# Altium footprint library WE-SHC.PcbLib: 139 footprints (part 1 of 10)
Each footprint in its own frame and in the unit in brackets; x right, y up, seen from the top. Pads: shape width x height; smd on the part's side, far side on the other; paste and mask are expansions set on the pad; w line width, h text height; cw(c..) or ccw(c..) is an arc to the next point about the centre after c.
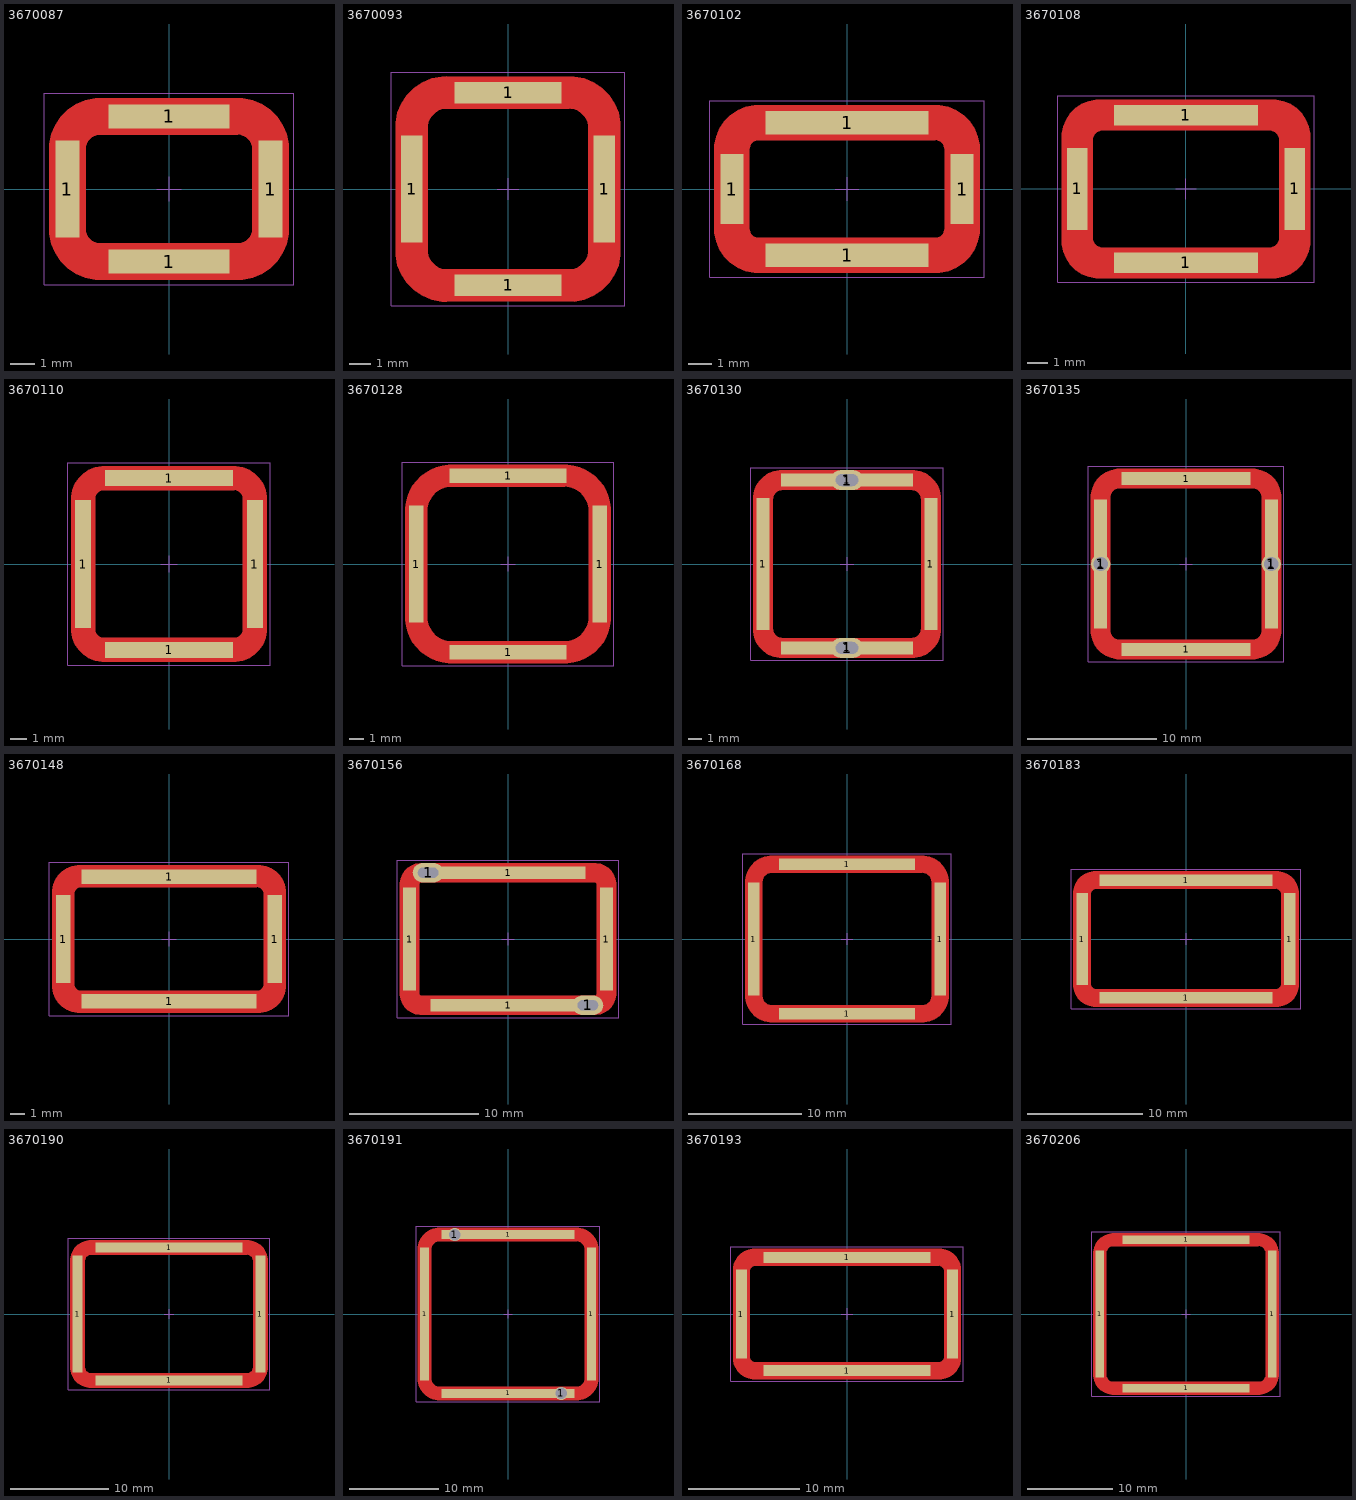
[diagram p0: the footprints below, top view; thin cyan lines are the x and y axes]

## 3670087 [mm] "Shielding Cabinet, SMT Frame Seamless, 8.7x6.3x3mm"
height 3
pads (4):
  rect 1x4 smd paste-2539.97 mask-2222: 1(-4.2,0) 1(4.2,0)
  rect 5x1 smd paste-2539.97 mask-2222: 1(0,-3) 1(0,3)
Top Layer:
  region: -4.95,-0.25 -4.95,-1.65 -4.95,-1.857 -4.869,-2.263 -4.711,-2.645 -4.481,-2.989 -4.189,-3.281 -3.845,-3.511 -3.463,-3.669 -3.057,-3.75 -2.85,-3.75 2.85,-3.75 3.057,-3.75 3.463,-3.669 3.845,-3.511 4.189,-3.281 4.481,-2.989 4.711,-2.645 4.869,-2.263 4.95,-1.857 4.95,-1.65 4.95,-0.25 3.45,-0.25 3.45,-1.65 3.438,-1.767 3.349,-1.983 3.183,-2.149 2.967,-2.238 2.85,-2.25 -2.85,-2.25 -2.967,-2.238 -3.183,-2.149 -3.349,-1.983 -3.438,-1.767 -3.45,-1.65 -3.45,-0.25
  region: -4.95,-1 -4.95,1.65 -4.95,1.857 -4.869,2.263 -4.711,2.645 -4.481,2.989 -4.189,3.281 -3.845,3.511 -3.463,3.669 -3.057,3.75 -2.85,3.75 2.85,3.75 3.057,3.75 3.463,3.669 3.845,3.511 4.189,3.281 4.481,2.989 4.711,2.645 4.869,2.263 4.95,1.857 4.95,1.65 4.95,-1 3.45,-1 3.45,1.65 3.438,1.767 3.349,1.983 3.183,2.149 2.967,2.238 2.85,2.25 -2.85,2.25 -2.967,2.238 -3.183,2.149 -3.349,1.983 -3.438,1.767 -3.45,1.65 -3.45,-1
Top Paste:
  region: -4.95,0.25 -4.95,1.65 -4.95,1.857 -4.869,2.263 -4.711,2.645 -4.481,2.989 -4.189,3.281 -3.845,3.511 -3.463,3.669 -3.057,3.75 -2.85,3.75 2.85,3.75 3.057,3.75 3.463,3.669 3.845,3.511 4.189,3.281 4.481,2.989 4.711,2.645 4.869,2.263 4.95,1.857 4.95,1.65 4.95,0.25 3.45,0.25 3.45,1.65 3.438,1.767 3.349,1.983 3.183,2.149 2.967,2.238 2.85,2.25 -2.85,2.25 -2.967,2.238 -3.183,2.149 -3.349,1.983 -3.438,1.767 -3.45,1.65 -3.45,0.25
  region: -4.95,-0.25 -4.95,-1.65 -4.95,-1.857 -4.869,-2.263 -4.711,-2.645 -4.481,-2.989 -4.189,-3.281 -3.845,-3.511 -3.463,-3.669 -3.057,-3.75 -2.85,-3.75 2.85,-3.75 3.057,-3.75 3.463,-3.669 3.845,-3.511 4.189,-3.281 4.481,-2.989 4.711,-2.645 4.869,-2.263 4.95,-1.857 4.95,-1.65 4.95,-0.25 3.45,-0.25 3.45,-1.65 3.438,-1.767 3.349,-1.983 3.183,-2.149 2.967,-2.238 2.85,-2.25 -2.85,-2.25 -2.967,-2.238 -3.183,-2.149 -3.349,-1.983 -3.438,-1.767 -3.45,-1.65 -3.45,-0.25
Notes:
  text "recommended tin paste thickness=0.5mm / customer to define the final stencil gap" at -4.45,-5.25 h0.3
Top Designator:
  text ".Designator" at -7.498,-0.5 h1.5
Top Component Outline:
  lines w0.1: -4.35,-1.65 ccw(c-2.85,-1.65) -2.85,-3.15 2.85,-3.15 ccw(c2.85,-1.65) 4.35,-1.65 4.35,1.65 ccw(c2.85,1.65) 2.85,3.15 -2.85,3.15 ccw(c-2.85,1.65) -4.35,1.65 -4.35,-1.65
Top 3D Body:
  lines w0.1: -4.35,-1.65 ccw(c-2.85,-1.65) -2.85,-3.15 2.85,-3.15 ccw(c2.85,-1.65) 4.35,-1.65 4.35,1.65 ccw(c2.85,1.65) 2.85,3.15 -2.85,3.15 ccw(c-2.85,1.65) -4.35,1.65 -4.35,-1.65
Top Courtyard:
  lines w0.05: -0.5,0 0.5,0 ; 0,-0.5 0,0.5 ; -5.15,-3.95 5.15,-3.95 5.15,3.95 -5.15,3.95 -5.15,-3.95
3D body "3670087.stp": height 3, standoff 0, extent -4.35,-3.15 4.35,3.15

## 3670093 [mm] "Shielding Cabinet, SMT Frame Seamless, 9.3x9.3x5mm"
height 5
pads (4):
  rect 1x5 smd paste-2539.97 mask-2222: 1(-4.5,0) 1(4.5,0)
  rect 5x1 smd paste-2539.97 mask-2222: 1(0,-4.5) 1(0,4.5)
Top Layer:
  region: -5.25,-0.25 -5.25,-2.85 -5.25,-3.086 -5.158,-3.55 -4.977,-3.987 -4.714,-4.38 -4.38,-4.714 -3.987,-4.977 -3.55,-5.158 -3.086,-5.25 -2.85,-5.25 2.85,-5.25 3.086,-5.25 3.55,-5.158 3.987,-4.977 4.38,-4.714 4.714,-4.38 4.977,-3.987 5.158,-3.55 5.25,-3.086 5.25,-2.85 5.25,-0.25 3.75,-0.25 3.75,-2.85 3.746,-2.938 3.711,-3.111 3.644,-3.274 3.546,-3.421 3.421,-3.546 3.274,-3.644 3.111,-3.711 2.938,-3.746 2.85,-3.75 -2.85,-3.75 -2.938,-3.746 -3.111,-3.711 -3.274,-3.644 -3.421,-3.546 -3.546,-3.421 -3.644,-3.274 -3.711,-3.111 -3.746,-2.938 -3.75,-2.85 -3.75,-0.25
  region: -5.25,-1 -5.25,2.85 -5.25,3.086 -5.158,3.55 -4.977,3.987 -4.714,4.38 -4.38,4.714 -3.987,4.977 -3.55,5.158 -3.086,5.25 -2.85,5.25 2.85,5.25 3.086,5.25 3.55,5.158 3.987,4.977 4.38,4.714 4.714,4.38 4.977,3.987 5.158,3.55 5.25,3.086 5.25,2.85 5.25,-1 3.75,-1 3.75,2.85 3.746,2.938 3.711,3.111 3.644,3.274 3.546,3.421 3.421,3.546 3.274,3.644 3.111,3.711 2.938,3.746 2.85,3.75 -2.85,3.75 -2.938,3.746 -3.111,3.711 -3.274,3.644 -3.421,3.546 -3.546,3.421 -3.644,3.274 -3.711,3.111 -3.746,2.938 -3.75,2.85 -3.75,-1
Top Paste:
  region: -5.25,0.25 -5.25,2.85 -5.25,3.086 -5.158,3.55 -4.977,3.987 -4.714,4.38 -4.38,4.714 -3.987,4.977 -3.55,5.158 -3.086,5.25 -2.85,5.25 2.85,5.25 3.086,5.25 3.55,5.158 3.987,4.977 4.38,4.714 4.714,4.38 4.977,3.987 5.158,3.55 5.25,3.086 5.25,2.85 5.25,0.25 3.75,0.25 3.75,2.85 3.746,2.938 3.711,3.111 3.644,3.274 3.546,3.421 3.421,3.546 3.274,3.644 3.111,3.711 2.938,3.746 2.85,3.75 -2.85,3.75 -2.938,3.746 -3.111,3.711 -3.274,3.644 -3.421,3.546 -3.546,3.421 -3.644,3.274 -3.711,3.111 -3.746,2.938 -3.75,2.85 -3.75,0.25
  region: -5.25,-0.25 -5.25,-2.85 -5.25,-3.086 -5.158,-3.55 -4.977,-3.987 -4.714,-4.38 -4.38,-4.714 -3.987,-4.977 -3.55,-5.158 -3.086,-5.25 -2.85,-5.25 2.85,-5.25 3.086,-5.25 3.55,-5.158 3.987,-4.977 4.38,-4.714 4.714,-4.38 4.977,-3.987 5.158,-3.55 5.25,-3.086 5.25,-2.85 5.25,-0.25 3.75,-0.25 3.75,-2.85 3.746,-2.938 3.711,-3.111 3.644,-3.274 3.546,-3.421 3.421,-3.546 3.274,-3.644 3.111,-3.711 2.938,-3.746 2.85,-3.75 -2.85,-3.75 -2.938,-3.746 -3.111,-3.711 -3.274,-3.644 -3.421,-3.546 -3.546,-3.421 -3.644,-3.274 -3.711,-3.111 -3.746,-2.938 -3.75,-2.85 -3.75,-0.25
Notes:
  text "recommended tin paste thickness=0.5mm / customer to define the final stencil gap" at -4.75,-6.65 h0.3
Top Designator:
  text ".Designator" at -7.498,-0.5 h1.5
Top Component Outline:
  lines w0.1: -4.65,-2.9 ccw(c-2.9,-2.9) -2.9,-4.65 2.9,-4.65 ccw(c2.9,-2.9) 4.65,-2.9 4.65,2.9 ccw(c2.9,2.9) 2.9,4.65 -2.9,4.65 ccw(c-2.9,2.9) -4.65,2.9 -4.65,-2.9
Top 3D Body:
  lines w0.1: -4.65,-2.9 ccw(c-2.9,-2.9) -2.9,-4.65 2.9,-4.65 ccw(c2.9,-2.9) 4.65,-2.9 4.65,2.9 ccw(c2.9,2.9) 2.9,4.65 -2.9,4.65 ccw(c-2.9,2.9) -4.65,2.9 -4.65,-2.9
Top Courtyard:
  lines w0.05: -0.5,0 0.5,0 ; 0,-0.5 0,0.5 ; -5.45,-5.45 -5.45,5.45 5.45,5.45 5.45,-5.45 -5.45,-5.45
3D body "3670093.stp": height 5, standoff 0, extent -4.65,-4.65 4.65,4.65

## 3670102 [mm] "Shielding Cabinet, SMT Frame Seamless, 10.2x6x3mm"
height 3
pads (4):
  rect 1x3 smd paste-2539.97 mask-2222: 1(-4.95,0) 1(4.95,0)
  rect 7x1 smd paste-2539.97 mask-2222: 1(0,-2.85) 1(0,2.85)
Top Layer:
  region: -5.7,-0.25 -5.7,-1.7 -5.7,-1.887 -5.627,-2.254 -5.484,-2.6 -5.276,-2.911 -5.011,-3.176 -4.7,-3.384 -4.354,-3.527 -3.987,-3.6 -3.8,-3.6 3.8,-3.6 3.987,-3.6 4.354,-3.527 4.7,-3.384 5.011,-3.176 5.276,-2.911 5.484,-2.6 5.627,-2.254 5.7,-1.887 5.7,-1.7 5.7,-0.25 4.2,-0.25 4.2,-1.7 4.192,-1.778 4.133,-1.922 4.022,-2.033 3.878,-2.092 3.8,-2.1 -3.8,-2.1 -3.878,-2.092 -4.022,-2.033 -4.133,-1.922 -4.192,-1.778 -4.2,-1.7 -4.2,-0.25
  region: -5.7,-1 -5.7,1.7 -5.7,1.887 -5.627,2.254 -5.484,2.6 -5.276,2.911 -5.011,3.176 -4.7,3.384 -4.354,3.527 -3.987,3.6 -3.8,3.6 3.8,3.6 3.987,3.6 4.354,3.527 4.7,3.384 5.011,3.176 5.276,2.911 5.484,2.6 5.627,2.254 5.7,1.887 5.7,1.7 5.7,-1 4.2,-1 4.2,1.7 4.192,1.778 4.133,1.922 4.022,2.033 3.878,2.092 3.8,2.1 -3.8,2.1 -3.878,2.092 -4.022,2.033 -4.133,1.922 -4.192,1.778 -4.2,1.7 -4.2,-1
Top Paste:
  region: -5.7,0.25 -5.7,1.7 -5.7,1.887 -5.627,2.254 -5.484,2.6 -5.276,2.911 -5.011,3.176 -4.7,3.384 -4.354,3.527 -3.987,3.6 -3.8,3.6 3.8,3.6 3.987,3.6 4.354,3.527 4.7,3.384 5.011,3.176 5.276,2.911 5.484,2.6 5.627,2.254 5.7,1.887 5.7,1.7 5.7,0.25 4.2,0.25 4.2,1.7 4.192,1.778 4.133,1.922 4.022,2.033 3.878,2.092 3.8,2.1 -3.8,2.1 -3.878,2.092 -4.022,2.033 -4.133,1.922 -4.192,1.778 -4.2,1.7 -4.2,0.25
  region: -5.7,-0.25 -5.7,-1.7 -5.7,-1.887 -5.627,-2.254 -5.484,-2.6 -5.276,-2.911 -5.011,-3.176 -4.7,-3.384 -4.354,-3.527 -3.987,-3.6 -3.8,-3.6 3.8,-3.6 3.987,-3.6 4.354,-3.527 4.7,-3.384 5.011,-3.176 5.276,-2.911 5.484,-2.6 5.627,-2.254 5.7,-1.887 5.7,-1.7 5.7,-0.25 4.2,-0.25 4.2,-1.7 4.192,-1.778 4.133,-1.922 4.022,-2.033 3.878,-2.092 3.8,-2.1 -3.8,-2.1 -3.878,-2.092 -4.022,-2.033 -4.133,-1.922 -4.192,-1.778 -4.2,-1.7 -4.2,-0.25
Notes:
  text "recommended tin paste thickness=0.1mm / customer to define the final stencil gap" at -5.9,-5.3 h0.4
Top Designator:
  text ".Designator" at -7.498,-0.5 h1.5
Top Component Outline:
  lines w0.1: -5.1,-1.75 ccw(c-3.85,-1.75) -3.85,-3 3.85,-3 ccw(c3.85,-1.75) 5.1,-1.75 5.1,1.75 ccw(c3.85,1.75) 3.85,3 -3.85,3 ccw(c-3.85,1.75) -5.1,1.75 -5.1,-1.75
Top 3D Body:
  lines w0.1: -5.1,-1.75 ccw(c-3.85,-1.75) -3.85,-3 3.85,-3 ccw(c3.85,-1.75) 5.1,-1.75 5.1,1.75 ccw(c3.85,1.75) 3.85,3 -3.85,3 ccw(c-3.85,1.75) -5.1,1.75 -5.1,-1.75
Top Courtyard:
  lines w0.05: -0.5,0 0.5,0 ; 0,-0.5 0,0.5 ; -5.9,-3.8 -5.9,3.8 5.9,3.8 5.9,-3.8 -5.9,-3.8
3D body "3670102.stp": height 3, standoff 0, extent -5.1,-3 5.1,3

## 3670108 [mm] "Shielding Cabinet, SMT Frame Seamless, 10.8x7.4x2mm"
height 2
pads (4):
  rect 1x4 smd paste-2539.97 mask-2222: 1(-5.3,0) 1(5.3,0)
  rect 7x1 smd paste-2539.97 mask-2222: 1(0,-3.6) 1(0,3.6)
Top Layer:
  region: -6.05,-0.925 -6.05,2.5 -6.05,2.682 -5.979,3.04 -5.839,3.376 -5.637,3.679 -5.379,3.937 -5.076,4.139 -4.74,4.279 -4.382,4.35 -4.2,4.35 4.2,4.35 4.382,4.35 4.74,4.279 5.076,4.139 5.379,3.937 5.637,3.679 5.839,3.376 5.979,3.04 6.05,2.682 6.05,2.5 6.05,-0.925 4.55,-0.925 4.55,2.387 4.541,2.478 4.472,2.644 4.344,2.772 4.178,2.841 4.088,2.85 -4.088,2.85 -4.178,2.841 -4.344,2.772 -4.472,2.644 -4.541,2.478 -4.55,2.387 -4.55,-0.925
  region: -6.05,-0.25 -6.05,-2.5 -6.05,-2.682 -5.979,-3.04 -5.839,-3.376 -5.637,-3.679 -5.379,-3.937 -5.076,-4.139 -4.74,-4.279 -4.382,-4.35 -4.2,-4.35 4.2,-4.35 4.382,-4.35 4.74,-4.279 5.076,-4.139 5.379,-3.937 5.637,-3.679 5.839,-3.376 5.979,-3.04 6.05,-2.682 6.05,-2.5 6.05,-0.25 4.55,-0.25 4.55,-2.387 4.541,-2.478 4.472,-2.644 4.344,-2.772 4.178,-2.841 4.088,-2.85 -4.088,-2.85 -4.178,-2.841 -4.344,-2.772 -4.472,-2.644 -4.541,-2.478 -4.55,-2.387 -4.55,-0.25
Top Paste:
  region: -6.05,-0.25 -6.05,-2.5 -6.05,-2.682 -5.979,-3.04 -5.839,-3.376 -5.637,-3.679 -5.379,-3.937 -5.076,-4.139 -4.74,-4.279 -4.382,-4.35 -4.2,-4.35 4.2,-4.35 4.382,-4.35 4.74,-4.279 5.076,-4.139 5.379,-3.937 5.637,-3.679 5.839,-3.376 5.979,-3.04 6.05,-2.682 6.05,-2.5 6.05,-0.25 4.55,-0.25 4.55,-2.387 4.541,-2.478 4.472,-2.644 4.344,-2.772 4.178,-2.841 4.088,-2.85 -4.088,-2.85 -4.178,-2.841 -4.344,-2.772 -4.472,-2.644 -4.541,-2.478 -4.55,-2.387 -4.55,-0.25
  region: -6.05,0.25 -6.05,2.5 -6.05,2.682 -5.979,3.04 -5.839,3.376 -5.637,3.679 -5.379,3.937 -5.076,4.139 -4.74,4.279 -4.382,4.35 -4.2,4.35 4.2,4.35 4.382,4.35 4.74,4.279 5.076,4.139 5.379,3.937 5.637,3.679 5.839,3.376 5.979,3.04 6.05,2.682 6.05,2.5 6.05,0.25 4.55,0.25 4.55,2.387 4.541,2.478 4.472,2.644 4.344,2.772 4.178,2.841 4.088,2.85 -4.088,2.85 -4.178,2.841 -4.344,2.772 -4.472,2.644 -4.541,2.478 -4.55,2.387 -4.55,0.25
Notes:
  text "recommended tin paste thickness=0.5mm / customer to define the final stencil gap" at -6.25,-5.95 h0.4
Top Designator:
  text ".Designator" at -7.498,-0.5 h1.5
Top Component Outline:
  lines w0.1: -5.4,-2.45 ccw(c-4.15,-2.45) -4.15,-3.7 4.15,-3.7 ccw(c4.15,-2.45) 5.4,-2.45 5.4,2.45 ccw(c4.15,2.45) 4.15,3.7 -4.15,3.7 ccw(c-4.15,2.45) -5.4,2.45 -5.4,-2.45
Top 3D Body:
  lines w0.1: -5.4,-2.45 ccw(c-4.15,-2.45) -4.15,-3.7 4.15,-3.7 ccw(c4.15,-2.45) 5.4,-2.45 5.4,2.45 ccw(c4.15,2.45) 4.15,3.7 -4.15,3.7 ccw(c-4.15,2.45) -5.4,2.45 -5.4,-2.45
Top Courtyard:
  lines w0.05: -0.5,0 0.5,0 ; 0,-0.5 0,0.5 ; -6.25,-4.55 -6.25,4.55 6.25,4.55 6.25,-4.55 -6.25,-4.55
3D body "3670108.stp": height 2, standoff 0, extent -5.4,-3.7 5.4,3.7

## 3670110 [mm] "Shielding Cabinet, SMT Frame Seamless, 11x11x2.8mm"
height 2.8
pads (4):
  rect 1x8 smd paste-2539.97 mask-2222: 1(-5.35,0) 1(5.35,0)
  rect 8x1 smd paste-2539.97 mask-2222: 1(0,-5.35) 1(0,5.35)
Top Layer:
  region: -6.1,-1.05 -6.1,4 -6.1,4.207 -6.019,4.613 -5.861,4.995 -5.631,5.339 -5.339,5.631 -4.995,5.861 -4.613,6.019 -4.207,6.1 -4,6.1 4,6.1 4.207,6.1 4.613,6.019 4.995,5.861 5.339,5.631 5.631,5.339 5.861,4.995 6.019,4.613 6.1,4.207 6.1,4 6.1,-1.05 4.6,-1.05 4.6,4.075 4.59,4.177 4.512,4.367 4.367,4.512 4.177,4.59 4.075,4.6 -4.075,4.6 -4.177,4.59 -4.367,4.512 -4.512,4.367 -4.59,4.177 -4.6,4.075 -4.6,-1.05
  region: -6.1,-0.25 -6.1,-4 -6.1,-4.207 -6.019,-4.613 -5.861,-4.995 -5.631,-5.339 -5.339,-5.631 -4.995,-5.861 -4.613,-6.019 -4.207,-6.1 -4,-6.1 4,-6.1 4.207,-6.1 4.613,-6.019 4.995,-5.861 5.339,-5.631 5.631,-5.339 5.861,-4.995 6.019,-4.613 6.1,-4.207 6.1,-4 6.1,-0.25 4.6,-0.25 4.6,-4.075 4.59,-4.177 4.512,-4.367 4.367,-4.512 4.177,-4.59 4.075,-4.6 -4.075,-4.6 -4.177,-4.59 -4.367,-4.512 -4.512,-4.367 -4.59,-4.177 -4.6,-4.075 -4.6,-0.25
Top Paste:
  region: -6.1,-0.25 -6.1,-4 -6.1,-4.207 -6.019,-4.613 -5.861,-4.995 -5.631,-5.339 -5.339,-5.631 -4.995,-5.861 -4.613,-6.019 -4.207,-6.1 -4,-6.1 4,-6.1 4.207,-6.1 4.613,-6.019 4.995,-5.861 5.339,-5.631 5.631,-5.339 5.861,-4.995 6.019,-4.613 6.1,-4.207 6.1,-4 6.1,-0.25 4.6,-0.25 4.6,-4.075 4.59,-4.177 4.512,-4.367 4.367,-4.512 4.177,-4.59 4.075,-4.6 -4.075,-4.6 -4.177,-4.59 -4.367,-4.512 -4.512,-4.367 -4.59,-4.177 -4.6,-4.075 -4.6,-0.25
  region: -6.1,0.25 -6.1,4 -6.1,4.207 -6.019,4.613 -5.861,4.995 -5.631,5.339 -5.339,5.631 -4.995,5.861 -4.613,6.019 -4.207,6.1 -4,6.1 4,6.1 4.207,6.1 4.613,6.019 4.995,5.861 5.339,5.631 5.631,5.339 5.861,4.995 6.019,4.613 6.1,4.207 6.1,4 6.1,0.25 4.6,0.25 4.6,4.075 4.59,4.177 4.512,4.367 4.367,4.512 4.177,4.59 4.075,4.6 -4.075,4.6 -4.177,4.59 -4.367,4.512 -4.512,4.367 -4.59,4.177 -4.6,4.075 -4.6,0.25
Notes:
  text "recommended tin paste thickness=0.5mm / customer to define the final stencil gap" at -6.3,-7.7 h0.4
Top Designator:
  text ".Designator" at -7.498,-0.5 h1.5
Top Component Outline:
  lines w0.1: -5.5,-4 ccw(c-4,-4) -4,-5.5 4,-5.5 ccw(c4,-4) 5.5,-4 5.5,4 ccw(c4,4) 4,5.5 -4,5.5 ccw(c-4,4) -5.5,4 -5.5,-4
Top 3D Body:
  lines w0.1: -5.5,-4 ccw(c-4,-4) -4,-5.5 4,-5.5 ccw(c4,-4) 5.5,-4 5.5,4 ccw(c4,4) 4,5.5 -4,5.5 ccw(c-4,4) -5.5,4 -5.5,-4
Top Courtyard:
  lines w0.05: -0.5,0 0.5,0 ; 0,-0.5 0,0.5 ; -6.3,-6.3 -6.3,6.3 6.3,6.3 6.3,-6.3 -6.3,-6.3
3D body "3670110.stp": height 2.8, standoff 0, extent -5.5,-5.5 5.5,5.5

## 3670128 [mm] "Shielding Cabinet, SMT Frame Seamless, 12.8x12.3x7.5mm"
height 7.5
pads (4):
  rect 1x8 smd paste-2539.97 mask-2222: 1(-6.3,0) 1(6.3,0)
  rect 8x1 smd paste-2539.97 mask-2222: 1(0,-6.05) 1(0,6.05)
Top Layer:
  region: -7.05,-0.25 -7.05,-3.65 -7.05,-3.856 -6.996,-4.266 -6.889,-4.665 -6.731,-5.046 -6.525,-5.404 -6.273,-5.731 -5.981,-6.023 -5.654,-6.275 -5.296,-6.481 -4.915,-6.639 -4.516,-6.746 -4.106,-6.8 -3.9,-6.8 3.9,-6.8 4.106,-6.8 4.516,-6.746 4.915,-6.639 5.296,-6.481 5.654,-6.275 5.981,-6.023 6.273,-5.731 6.525,-5.404 6.731,-5.046 6.889,-4.665 6.996,-4.266 7.05,-3.856 7.05,-3.65 7.05,-0.25 5.55,-0.25 5.55,-3.65 5.542,-3.812 5.479,-4.129 5.355,-4.428 5.175,-4.697 4.947,-4.925 4.678,-5.105 4.379,-5.229 4.062,-5.292 3.9,-5.3 -3.9,-5.3 -4.062,-5.292 -4.379,-5.229 -4.678,-5.105 -4.947,-4.925 -5.175,-4.697 -5.355,-4.428 -5.479,-4.129 -5.542,-3.812 -5.55,-3.65 -5.55,-0.25
  region: -7.05,-1 -7.05,3.65 -7.05,3.856 -6.996,4.266 -6.889,4.665 -6.731,5.046 -6.525,5.404 -6.273,5.731 -5.981,6.023 -5.654,6.275 -5.296,6.481 -4.915,6.639 -4.516,6.746 -4.106,6.8 -3.9,6.8 3.9,6.8 4.106,6.8 4.516,6.746 4.915,6.639 5.296,6.481 5.654,6.275 5.981,6.023 6.273,5.731 6.525,5.404 6.731,5.046 6.889,4.665 6.996,4.266 7.05,3.856 7.05,3.65 7.05,-1 5.55,-1 5.55,3.65 5.542,3.812 5.479,4.129 5.355,4.428 5.175,4.697 4.947,4.925 4.678,5.105 4.379,5.229 4.062,5.292 3.9,5.3 -3.9,5.3 -4.062,5.292 -4.379,5.229 -4.678,5.105 -4.947,4.925 -5.175,4.697 -5.355,4.428 -5.479,4.129 -5.542,3.812 -5.55,3.65 -5.55,-1
Top Paste:
  drawing of 3 lines, arcs and shapes, not listed
Notes:
  text "recommended tin paste thickness=0.1mm / customer to define the final stencil gap" at -6.2,-8.5 h0.4
Top Designator:
  text ".Designator" at -7.498,-0.5 h1.5
Top Component Outline:
  lines w0.1: -6.4,-3.9 -6.4,3.65 cw(c-3.9,3.65) -3.9,6.15 3.9,6.15 cw(c3.9,3.65) 6.4,3.65 6.4,-3.9 ; -6.4,-3.65 ccw(c-3.9,-3.65) -3.9,-6.15 3.9,-6.15 ccw(c3.9,-3.65) 6.4,-3.65
Top 3D Body:
  lines w0.1: -6.4,-3.9 -6.4,3.65 cw(c-3.9,3.65) -3.9,6.15 3.9,6.15 cw(c3.9,3.65) 6.4,3.65 6.4,-3.9 ; -6.4,-3.65 ccw(c-3.9,-3.65) -3.9,-6.15 3.9,-6.15 ccw(c3.9,-3.65) 6.4,-3.65
Top Courtyard:
  lines w0.05: -0.5,0 0.5,0 ; 0,-0.5 0,0.5 ; -7.25,-7 -7.25,7 7.25,7 7.25,-7 -7.25,-7
3D body "3670128.stp": height 7.5, standoff 0, extent -6.4,-6.15 6.4,6.15

## 3670130 [mm] "Shielding Cabinet, SMT Frame Seamless, 13x13x5mm"
height 5
pads (6):
  rect 1x10 smd paste-2539.97 mask-2222: 1(-6.35,0) 1(6.35,0)
  rect 10x1 smd paste-2539.97 mask-2222: 1(0,-6.35) 1(0,6.35)
  oval 2.5x1.5 hole 0.9 slot 1.7 at 0 deg: 1(0,-6.35) 1(0,6.35)
Top Layer:
  region: -7.1,-1 -7.1,4.9 -7.1,5.117 -7.015,5.542 -6.85,5.942 -6.609,6.302 -6.302,6.609 -5.942,6.85 -5.542,7.015 -5.117,7.1 -4.9,7.1 4.9,7.1 5.117,7.1 5.542,7.015 5.942,6.85 6.302,6.609 6.609,6.302 6.85,5.942 7.015,5.542 7.1,5.117 7.1,4.9 7.1,-1 5.6,-1 5.6,4.9 5.597,4.969 5.57,5.103 5.517,5.23 5.441,5.344 5.344,5.441 5.23,5.517 5.103,5.57 4.969,5.597 4.9,5.6 -4.9,5.6 -4.969,5.597 -5.103,5.57 -5.23,5.517 -5.344,5.441 -5.441,5.344 -5.517,5.23 -5.57,5.103 -5.597,4.969 -5.6,4.9 -5.6,-1
  region: -7.1,-0.25 -7.1,-4.9 -7.1,-5.117 -7.015,-5.542 -6.85,-5.942 -6.609,-6.302 -6.302,-6.609 -5.942,-6.85 -5.542,-7.015 -5.117,-7.1 -4.9,-7.1 4.9,-7.1 5.117,-7.1 5.542,-7.015 5.942,-6.85 6.302,-6.609 6.609,-6.302 6.85,-5.942 7.015,-5.542 7.1,-5.117 7.1,-4.9 7.1,-0.25 5.6,-0.25 5.6,-4.9 5.597,-4.969 5.57,-5.103 5.517,-5.23 5.441,-5.344 5.344,-5.441 5.23,-5.517 5.103,-5.57 4.969,-5.597 4.9,-5.6 -4.9,-5.6 -4.969,-5.597 -5.103,-5.57 -5.23,-5.517 -5.344,-5.441 -5.441,-5.344 -5.517,-5.23 -5.57,-5.103 -5.597,-4.969 -5.6,-4.9 -5.6,-0.25
Top Paste:
  region: -7.1,-0.25 -7.1,-4.9 -7.1,-5.117 -7.015,-5.542 -6.85,-5.942 -6.609,-6.302 -6.302,-6.609 -5.942,-6.85 -5.542,-7.015 -5.117,-7.1 -4.9,-7.1 4.9,-7.1 5.117,-7.1 5.542,-7.015 5.942,-6.85 6.302,-6.609 6.609,-6.302 6.85,-5.942 7.015,-5.542 7.1,-5.117 7.1,-4.9 7.1,-0.25 5.6,-0.25 5.6,-4.9 5.597,-4.969 5.57,-5.103 5.517,-5.23 5.441,-5.344 5.344,-5.441 5.23,-5.517 5.103,-5.57 4.969,-5.597 4.9,-5.6 -4.9,-5.6 -4.969,-5.597 -5.103,-5.57 -5.23,-5.517 -5.344,-5.441 -5.441,-5.344 -5.517,-5.23 -5.57,-5.103 -5.597,-4.969 -5.6,-4.9 -5.6,-0.25
  region: -7.1,0.25 -7.1,4.9 -7.1,5.117 -7.015,5.542 -6.85,5.942 -6.609,6.302 -6.302,6.609 -5.942,6.85 -5.542,7.015 -5.117,7.1 -4.9,7.1 4.9,7.1 5.117,7.1 5.542,7.015 5.942,6.85 6.302,6.609 6.609,6.302 6.85,5.942 7.015,5.542 7.1,5.117 7.1,4.9 7.1,0.25 5.6,0.25 5.6,4.9 5.597,4.969 5.57,5.103 5.517,5.23 5.441,5.344 5.344,5.441 5.23,5.517 5.103,5.57 4.969,5.597 4.9,5.6 -4.9,5.6 -4.969,5.597 -5.103,5.57 -5.23,5.517 -5.344,5.441 -5.441,5.344 -5.517,5.23 -5.57,5.103 -5.597,4.969 -5.6,4.9 -5.6,0.25
Notes:
  text "recommended tin paste thickness=0.5mm / customer to define the final stencil gap" at -5.9,-8.7 h0.4
Top Designator:
  text ".Designator" at -7.498,-0.5 h1.5
Top Component Outline:
  lines w0.1: -6.5,-5 ccw(c-5,-5) -5,-6.5 5,-6.5 ccw(c5,-5) 6.5,-5 6.5,5 ccw(c5,5) 5,6.5 -5,6.5 ccw(c-5,5) -6.5,5 -6.5,-5
Top 3D Body:
  lines w0.1: -6.5,-5 ccw(c-5,-5) -5,-6.5 5,-6.5 ccw(c5,-5) 6.5,-5 6.5,5 ccw(c5,5) 5,6.5 -5,6.5 ccw(c-5,5) -6.5,5 -6.5,-5
Top Courtyard:
  lines w0.05: -0.5,0 0.5,0 ; 0,-0.5 0,0.5 ; -7.3,-7.3 -7.3,7.3 7.3,7.3 7.3,-7.3 -7.3,-7.3
3D body "3670130.stp": height 5, standoff -1, extent -6.5,-6.5 6.5,6.5
